# Altium footprint library BMS_V2.1_Adv.PcbLib: 66 footprints (part 1 of 5)
Each footprint in its own frame and in the unit in brackets; x right, y up, seen from the top. Pads: shape width x height; smd on the part's side, far side on the other; paste and mask are expansions set on the pad; w line width, h text height; cw(c..) or ccw(c..) is an arc to the next point about the centre after c.
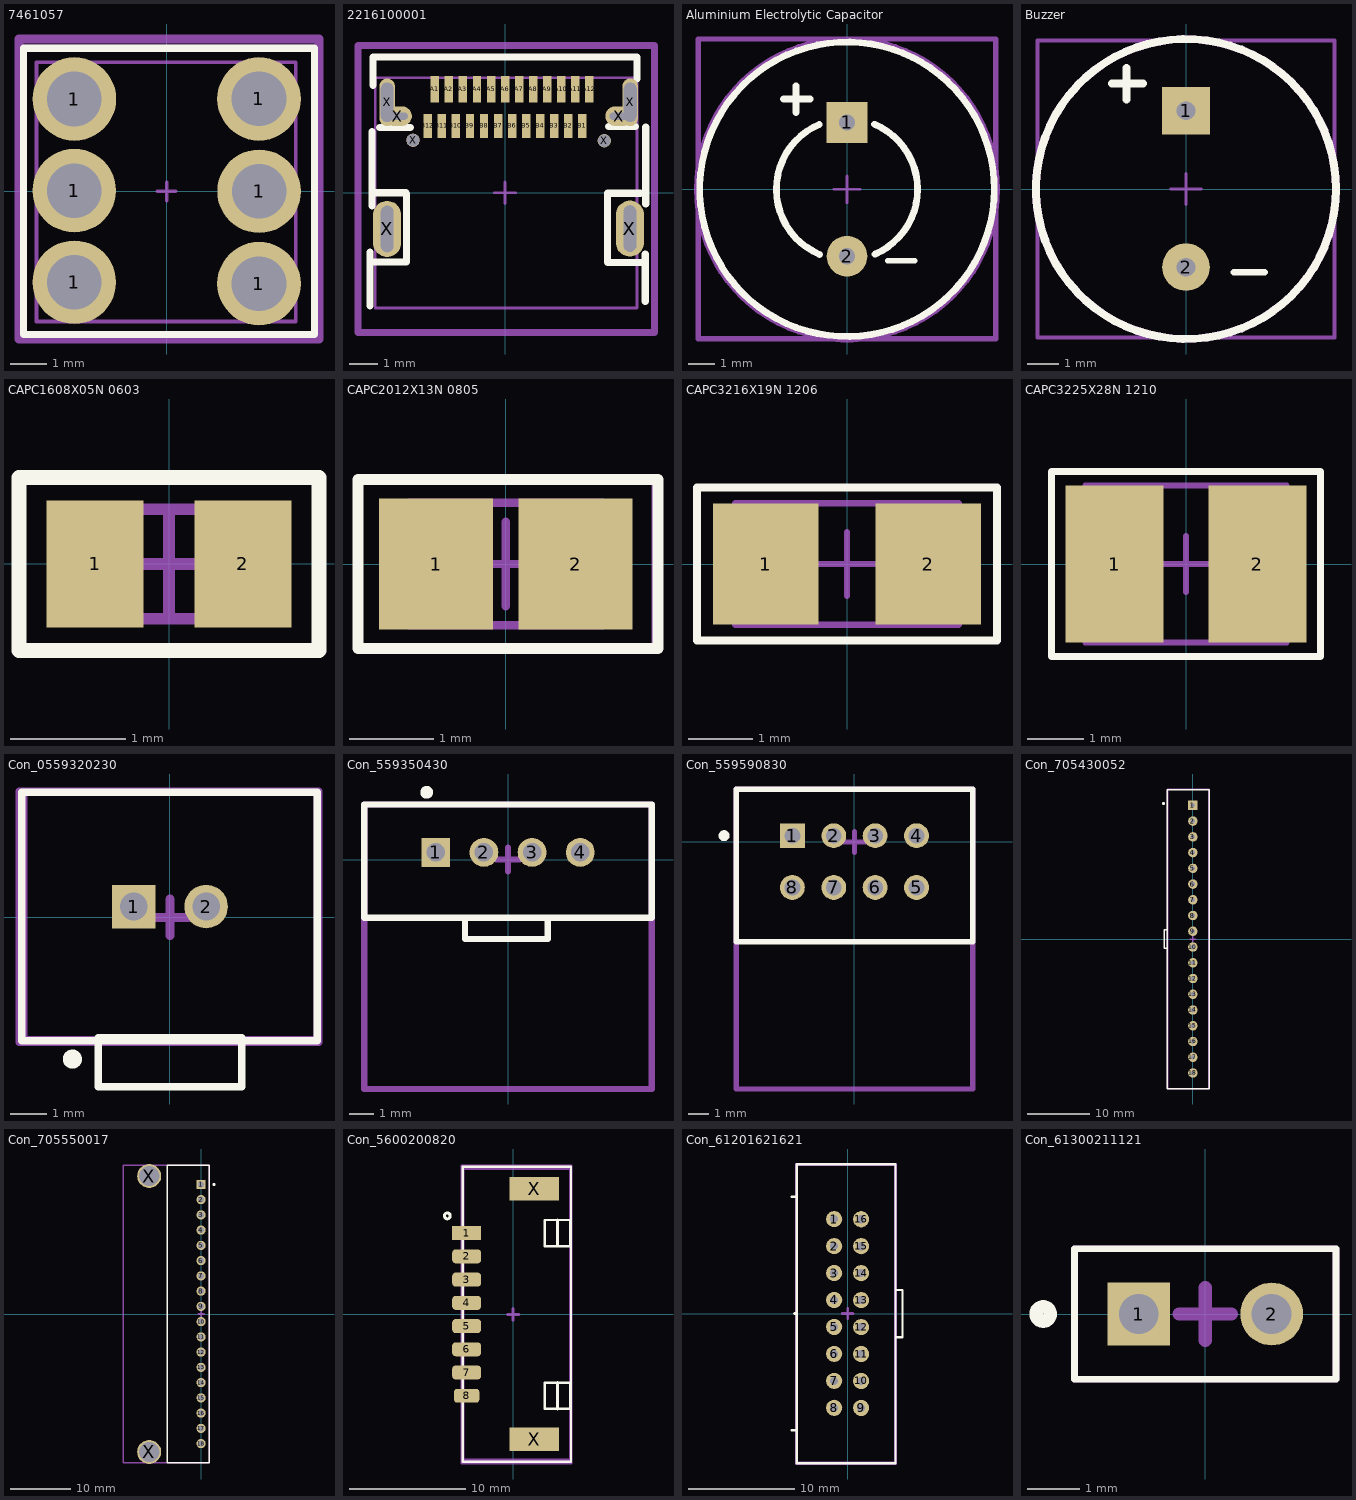
[diagram p0: the footprints below, top view; thin cyan lines are the x and y axes]

## 7461057 [mm] "7461057 Screw Terminal"
height 6
pads (6):
  round 2.3 hole 1.5: 1(-2.543,-2.501) 1(-2.543,0.02) 1(-2.54,2.54) 1(2.54,-2.54) 1(2.54,2.541) 1(2.543,0)
Top Overlay:
  lines w0.2: -3.937,-3.937 -3.937,3.937 4.064,3.937 4.064,-3.937 -3.937,-3.937
Mechanical 13:
  lines w0.1: -3.581,-3.581 3.556,-3.581 3.556,3.556 -3.581,3.556 -3.581,-3.581
  lines w0.2: -3.937,-3.937 -3.937,3.937 4.064,3.937 4.064,-3.937 -3.937,-3.937
  text ".Designator" at -1.524,-0.025 h0.69
Mechanical 15:
  lines w0.1: -0.254,0 0.254,0 ; 0,-0.254 0,0.254
  lines w0.254: -4.064,-4.064 -4.064,4.191 4.191,4.191 4.191,-4.064 -4.064,-4.064
3D body "7461057.stp": height 6, standoff -3.5, extent -3.5,-3.5 3.5,3.5

## 2216100001 [mm] "USB Type C"
height 2.6
pads (34):
  rect 0.3x0.95 smd: A1(-2.5,3.683) A2(-2,3.683) A3(-1.5,3.683) A4(-1,3.683) A5(-0.5,3.683) A6(0,3.683) A7(0.5,3.683) A8(1,3.683) A9(1.5,3.683) A10(2,3.683) A11(2.5,3.683) A12(3,3.683)
  rect 0.3x0.85 smd: B1(2.75,2.375) B2(2.25,2.375) B3(1.75,2.375) B4(1.25,2.375) B5(0.75,2.375) B6(0.25,2.375) B7(-0.25,2.375) B8(-0.75,2.375) B9(-1.25,2.375) B10(-1.75,2.375) B11(-2.25,2.375) B12(-2.75,2.375)
  oval 0.55x1.7 hole 0.45 slot 1.4 at 90 deg: X(-4.199,3.216) X(4.453,3.216)
  oval 1x2 hole 0.45 slot 1.65 at 90 deg: X(-4.198,-1.292) X(4.442,-1.279)
  round 0 on Drill Drawing: X(-3.937,3.302) X(4.191,2.921)
  oval 1x0.7 hole 0.25 slot 0.7 at 0 deg: X(-3.815,2.722) X(4.069,2.722)
  round 0.475 hole 0.45: X(-3.276,1.865) X(3.529,1.849)
Top Overlay:
  lines w0.254: -4.807,-4.037 -4.807,-2.116 ; -4.791,-2.466 -3.521,-2.466 -3.505,-2.45 -3.505,-0.037 -3.537,-0.005 -4.711,-0.005 ; -4.743,-0.465 -4.743,2.17 ; -4.699,3.81 -4.699,4.826 4.699,4.826 4.699,4.048 ; -4.47,2.314 -3.368,2.314 ; 3.688,2.354 4.639,2.354 ; 4.814,-0.021 3.655,-0.021 3.64,-0.037 3.64,-2.482 4.941,-2.482 ; 4.989,-3.879 4.989,-2.18 ; 5.005,-0.402 5.005,2.329
Mechanical 13:
  lines w0.1: -4.623,-4.102 4.699,-4.102 4.699,4.089 -4.623,4.089 -4.623,-4.102
  text ".Designator" at -2.54,-0.152 h0.69
Mechanical 15:
  lines w0.1: -0.381,0 0.381,0 ; 0,-0.381 0,0.381
  lines w0.254: -5.236,-4.974 5.322,-4.974 5.322,5.234 -5.236,5.234 -5.236,-4.974
3D body "2216100001.stp": height 3.17, standoff -0.59, extent -4.346,-4.036 4.599,4.064

## Aluminium Electrolytic Capacitor [mm] "Electrolytic Capacitor -Through Hole"
height 17
pads (2):
  rect 1.524x1.524 hole 0.6: 1(0,2.5)
  round 1.524 hole 0.6: 2(0,-2.5)
Top Overlay:
  circle w0.254: c0,0 r5.5
  lines w0.203: 1.524,-2.667 2.524,-2.667
  lines w0.254: -2.372,3.378 -1.372,3.378 ; -1.905,2.87 -1.905,3.87 ; -1.039,2.424 ccw(c0,0) -1.024,-2.431 ; 1.024,2.431 cw(c0,0) 1.039,-2.424
Mechanical 13:
  circle w0.254: c0,0 r5.591
  text ".Designator" at -3.174,-0.152 h0.69
Mechanical 15:
  lines w0.1: -0.5,0 0.5,0 ; 0,-0.5 0,0.5
  lines w0.203: -5.563,-5.588 5.563,-5.588 5.563,5.613 -5.563,5.613 -5.563,-5.588
3D body "ESW476M100AH2AA.step": height 17.03, standoff -19.99, extent -5.267,-5.249 5.307,5.249

## Buzzer [mm] "Buzzer - Through Hole"
height 5.5
pads (2):
  rect 1.524x1.524 hole 0.6: 1(0,2.5)
  round 1.524 hole 0.6: 2(0,-2.5)
Top Overlay:
  circle w0.254: c0,0 r4.8
  lines w0.203: 1.524,-2.667 2.524,-2.667
  lines w0.254: -2.372,3.378 -1.372,3.378 ; -1.905,2.87 -1.905,3.87
Mechanical 13:
  circle w0.254: c0,0 r4.8
  text ".Designator" at -3.225,0.254 h0.69
Mechanical 15:
  lines w0.1: -0.5,0 0.5,0 ; 0,-0.5 0,0.5
  lines w0.127: -4.75,-4.75 4.75,-4.75 4.75,4.75 -4.75,4.75 -4.75,-4.75
3D body "AI-1027-TWT-5V-R.step": height 5.06, standoff -4.49, extent -4.75,-5.934 4.75,4.759

## CAPC1608X05N 0603 [mm] "Chip Capacitor, 2-Leads, Body 1.55x0.85mm, IPC Medium Density"
height 0.5
pads (2):
  rect 0.84x1.1 smd: 1(-0.64,0) 2(0.64,0)
Top Overlay:
  lines w0.127: -1.3,-0.75 1.3,-0.75 1.3,0.75 -1.3,0.75 -1.3,-0.75
Mechanical 13:
  lines w0.1: -0.825,-0.475 0.825,-0.475 0.825,0.475 -0.825,0.475 -0.825,-0.475
  text ".Designator" at -0.825,-0.475 h0.69
Mechanical 15:
  lines w0.05: -1.3,-0.75 1.3,-0.75 1.3,0.75 -1.3,0.75 -1.3,-0.75
  lines w0.1: -0.475,0 0.475,0 ; 0,-0.475 0,0.475
3D body "CAP 0603 (3).step": height 0.91, standoff 0.01, extent -0.8,-0.4 0.8,0.4

## CAPC2012X13N 0805 [mm] "Chip Capacitor, 2-Leads, Body 2.05x1.23mm, IPC Medium Density"
height 1.3
pads (2):
  rect 1.35x1.55 smd: 1(-0.825,0) 2(0.825,0)
Top Overlay:
  lines w0.127: -1.75,-1 1.801,-1 1.801,1 -1.75,1 -1.75,-1
Mechanical 13:
  lines w0.1: -1.15,-0.725 -1.15,0.725 1.15,0.725 1.15,-0.725 -1.15,-0.725
  text ".Designator" at -1.397,-0.508 h0.69
Mechanical 15:
  lines w0.05: -1.75,-1 1.75,-1 1.75,1 -1.75,1 -1.75,-1
  lines w0.1: -0.5,0 0.5,0 ; 0,-0.5 0,0.5
3D body "CAP 0805.step": height 1.46, standoff 0.01, extent -1.1,-0.688 1.1,0.762

## CAPC3216X19N 1206 [mm] "Chip Capacitor, 2-Leads, Body 3.20x1.60mm, IPC Medium Density"
height 1.9
pads (2):
  rect 1.65x1.9 smd: 1(-1.275,0) 2(1.275,0)
Top Overlay:
  lines w0.127: -2.35,-1.2 2.35,-1.2 2.35,1.2 -2.35,1.2 -2.35,-1.2
Mechanical 13:
  lines w0.1: -1.75,-0.95 1.75,-0.95 1.75,0.95 -1.75,0.95 -1.75,-0.95
  text ".Designator" at -1.397,-0.152 h0.69
Mechanical 15:
  lines w0.05: -2.35,-1.2 2.35,-1.2 2.35,1.2 -2.35,1.2 -2.35,-1.2
  lines w0.1: -0.5,0 0.5,0 ; 0,-0.5 0,0.5
3D body "CAPC3216X19N.step": height 1.9, standoff 0, extent -1.75,-0.95 1.75,0.95

## CAPC3225X28N 1210 [mm] "Chip Capacitor, 2-Leads, Body 3.20x2.50mm, IPC Medium Density"
height 2.8
pads (2):
  rect 1.75x2.8 smd: 1(-1.275,0) 2(1.275,0)
Top Overlay:
  lines w0.127: -2.4,-1.65 2.4,-1.65 2.4,1.65 -2.4,1.65 -2.4,-1.65
Mechanical 13:
  lines w0.1: -1.8,-1.4 1.8,-1.4 1.8,1.4 -1.8,1.4 -1.8,-1.4
  text ".Designator" at -1.524,-0.381 h0.69
Mechanical 15:
  lines w0.05: -2.4,-1.65 2.4,-1.65 2.4,1.65 -2.4,1.65 -2.4,-1.65
  lines w0.1: -0.5,0 0.5,0 ; 0,-0.5 0,0.5
3D body "CAP 1210.step": height 2.79, standoff 0, extent -1.803,-1.397 1.803,1.397

## Con_0559320230 [mm] "2 Pin Connector - Through Hole - 2mm Pitch"
height 9.75
pads (2):
  rect 1.2x1.2 hole 0.762: 1(-1,0.3)
  round 1.2 hole 0.762: 2(1,0.3)
Top Overlay:
  circle w0.254: c-2.692,-3.912 r0.137
  lines w0.203: -4.089,-3.404 -4.089,3.454 4.064,3.454 4.064,-3.404 -4.089,-3.404 ; -1.981,-4.673 -1.981,-3.327 1.981,-3.327 1.981,-4.673 -1.981,-4.673
Mechanical 13:
  lines w0.203: -4.039,-3.378 -4.039,3.454 4.064,3.454 4.064,-3.378 -4.039,-3.378
  text ".Designator" at -3.429,1.753 h0.69
Mechanical 15:
  lines w0.203: -4.166,-3.454 -4.166,3.48 4.115,3.48 4.115,-3.454 -4.166,-3.454
  lines w0.254: -0.5,0 0.5,0 ; 0,-0.5 0,0.5
3D body "559320230.stp": height 9.76, standoff -3.18, extent -4,-3.35 4,3.35

## Con_559350430 [mm] "559350430 2mm Pitch connector"
pads (4):
  rect 1.2x1.2 hole 0.762: 1(-3,0.3)
  round 1.2 hole 0.762: 2(-1,0.3) 3(1,0.3) 4(3,0.3)
Top Overlay:
  circle w0.254: c-3.378,2.794 r0.137
  lines w0.254: -5.969,-2.413 5.969,-2.413 5.969,2.286 -5.969,2.286 -5.969,-2.413 ; -1.778,-3.302 1.651,-3.302 1.651,-2.413 -1.778,-2.413 -1.778,-3.302
Mechanical 13:
  lines w0.254: -5.969,-9.525 5.969,-9.525 5.969,2.286 -5.969,2.286 -5.969,-9.525
  text ".Designator" at -3.429,1.753 h0.69
Mechanical 15:
  lines w0.254: -0.5,0 0.5,0 ; 0,-0.5 0,0.5 ; -5.969,-9.525 5.969,-9.525 5.969,2.286 -5.969,2.286 -5.969,-9.525
3D body "559350430.stp": height 6.7, standoff -3.21, extent -6,-9.464 6,2.286

## Con_559590830 [mm] "559590830 2mm Pitch connector"
pads (8):
  rect 1.2x1.2 hole 0.762: 1(-3,0.3)
  round 1.2 hole 0.762: 2(-1,0.3) 3(1,0.3) 4(3,0.3) 5(3,-2.2) 6(1,-2.2) 7(-1,-2.2) 8(-3,-2.2)
Top Overlay:
  circle w0.254: c-6.299,0.3 r0.137
  lines w0.254: -5.715,-4.826 5.715,-4.826 5.715,2.54 -5.715,2.54 -5.715,-4.826
Mechanical 1:
  lines w0.254: -5.707,-11.938 5.715,-11.938 5.715,2.556 -5.707,2.556 -5.707,-11.938
Mechanical 13:
  text ".Designator" at -3.556,-4.089 h0.69
Mechanical 15:
  lines w0.254: -0.5,0 0.5,0 ; 0,-0.5 0,0.5 ; -5.715,-11.938 5.715,-11.938 5.715,2.54 -5.715,2.54 -5.715,-11.938
3D body "559590830.stp": height 11.51, standoff -3.39, extent -5.7,-11.945 5.7,2.555

## Con_705430052 [mil] "18 Pin Through Hole Connector -2.54mm Pitch"
height 450
pads (18):
  rect 60x60 hole 30: 1(0,850)
  round 60 hole 30: 2(0,750) 3(0,650) 4(0,550) 5(0,450) 6(0,350) 7(0,250) 8(0,150) 9(0,50) 10(0,-50) 11(0,-150) 12(0,-250) 13(0,-350) 14(0,-450) 15(0,-550) 16(0,-650) 17(0,-750) 18(0,-850)
Top Overlay:
  circle w10: c-187,862 r5
  lines w8: -181,-59.06 -181,59.06 -163,59.06 -163,-59.06 -181,-59.06 ; -162,-951 -162,950 104,950 104,-951 -162,-951
Mechanical 13:
  lines w8: -161,-949 -161,951 102,951 102,-949 -161,-949
  text ".Designator" at -105,-11 h27
Mechanical 15:
  lines w8: -164,-952 -164,954 105,954 105,-952 -164,-952
  lines w10: -19.68,0 19.68,0 ; 0,-19.68 0,19.68
3D body "70543-0052.STEP": height 450.5, standoff -144.5, extent -160,-950 100,950

## Con_705550017 [mil] "18 Pin Through Hole Connector -2.54mm Pitch,RA"
height 450
pads (20):
  rect 60x60 hole 40: 1(0,850)
  round 60 hole 40: 2(0,750) 3(0,650) 4(0,550) 5(0,450) 6(0,350) 7(0,250) 8(0,150) 9(0,50) 10(0,-50) 11(0,-150) 12(0,-250) 13(0,-350) 14(0,-450) 15(0,-550) 16(0,-650) 17(0,-750) 18(0,-850)
  round 157.48 hole 133.86: X(-340.16,-905.12) X(-340.16,905.12)
Top Overlay:
  circle w10: c85,850 r5
  lines w10: -220,-975 55,-975 55,975 -220,975 -220,-975
Mechanical 13:
  lines w10: -510,-975 55,-975 55,975 -510,975 -510,-975
  text ".Designator" at -385,34 h27
Mechanical 15:
  lines w10: -19.68,0 19.68,0 ; 0,-19.68 0,19.68 ; -510,-975 55,-975 55,975 -510,975 -510,-975
3D body "705550017.stp": height 260.5, standoff -144.5, extent -510,-975 25,975

## Con_5600200820 [mm] "8 Pin - SMD - 2mm Pitch"
height 8
pads (10):
  rect 2.5x1.2 smd: 1(-4,7)
  rrect50% 2.5x1.2 smd: 2(-4,5) 3(-4,3) 4(-4,1) 5(-4,-1) 6(-4,-3) 7(-4,-5)
  rrect50% 2.2x1.2 smd: 8(-4,-7)
  rect 4.25x2 smd: X(1.813,-10.752) X(1.813,10.828)
Top Overlay:
  circle w0.254: c-5.664,8.484 r0.25
  lines w0.203: -4.343,-12.675 4.978,-12.675 4.978,12.725 -4.343,12.725 -4.343,-12.675 ; 2.718,-8.13 4.928,-8.13 4.928,-5.87 2.718,-5.87 2.718,-8.13 ; 2.718,5.87 4.928,5.87 4.928,8.13 2.718,8.13 2.718,5.87
  lines w0.254: 3.823,-8.13 3.823,-5.87 ; 3.823,5.87 3.823,8.13
Mechanical 1:
  lines w0.203: -4.293,-12.497 4.928,-12.497 4.928,12.548 -4.293,12.548 -4.293,-12.497
  text ".Designator" at -1.651,0.102 h0.69
Mechanical 15:
  lines w0.203: -4.445,-12.814 5.029,-12.814 5.029,12.827 -4.445,12.827 -4.445,-12.814
  lines w0.254: -0.5,0 0.5,0 ; 0,-0.5 0,0.5
3D body "5600200820.stp": height 8.01, standoff 0.01, extent -4.29,-11.3 4.86,11.3

## Con_61201621621 [mil] "16 Pin connector - 2mm Pitch - Through Hole"
height 358.27
pads (16):
  round 60 hole 30: 1(-50,350.47) 2(-50,250.47) 3(-50,150.47) 4(-50,50.47) 5(-50,-49.53) 6(-50,-149.53) 7(-50,-249.53) 8(-50,-349.53) 9(50,-350) 10(50,-250) 11(50,-150) 12(50,-50) 13(50,50) 14(50,150) 15(50,250) 16(50,350)
Top Overlay:
  lines w8: -189,-555 -189,554 177,554 177,-555 -189,-555 ; 177,-88 177,88 203,88 203,-88 177,-88
  lines w10: -208,433.07 -194,433.07 ; -207,-433.07 -193,-433.07 ; -197,0 -193,0
Mechanical 13:
  lines w8: -188,-552 -188,552 176,552 176,-552 -188,-552
  text ".Designator" at -115,-6 h27
Mechanical 15:
  lines w8: -191,-558 -191,555 179,555 179,-558 -191,-558
  lines w10: -19.68,0 19.68,0 ; 0,-19.68 0,19.68
3D body "61201621621_Download_STP_61201621621_rev1.stp": height 348.93, standoff -127.45, extent -186.91,-550.78 174.22,550.79

## Con_61300211121 [mm] "2 Pin Connector - Through Hole - 2mm Pitch"
height 9.75
pads (2):
  rect 1.2x1.2 hole 0.762: 1(-1.27,0)
  round 1.2 hole 0.762: 2(1.27,0)
Top Overlay:
  lines w0.127: -2.5,-1.25 2.5,-1.25 2.5,1.25 -2.5,1.25 -2.5,-1.25
  lines w0.254: -2.963,0.015 ccw(c-3.099,0) -2.962,0
Mechanical 13:
  lines w0.127: -2.5,-1.25 2.5,-1.25 2.5,1.25 -2.5,1.25 -2.5,-1.25
  text ".Designator" at -3.353,1.651 h0.69
Mechanical 15:
  lines w0.127: -2.5,-1.25 2.5,-1.25 2.5,1.25 -2.5,1.25 -2.5,-1.25
  lines w0.254: -0.5,0 0.5,0 ; 0,-0.5 0,0.5
3D body "61300211121_Download_STP_61300211121_rev1.stp": height 8.05, standoff -3.49, extent -2.54,-1.27 2.54,1.27